# Altium footprint library common.PcbLib: 552 footprints (part 9 of 35)
Each footprint in its own frame and in the unit in brackets; x right, y up, seen from the top. Pads: shape width x height; smd on the part's side, far side on the other; paste and mask are expansions set on the pad; w line width, h text height; cw(c..) or ccw(c..) is an arc to the next point about the centre after c.
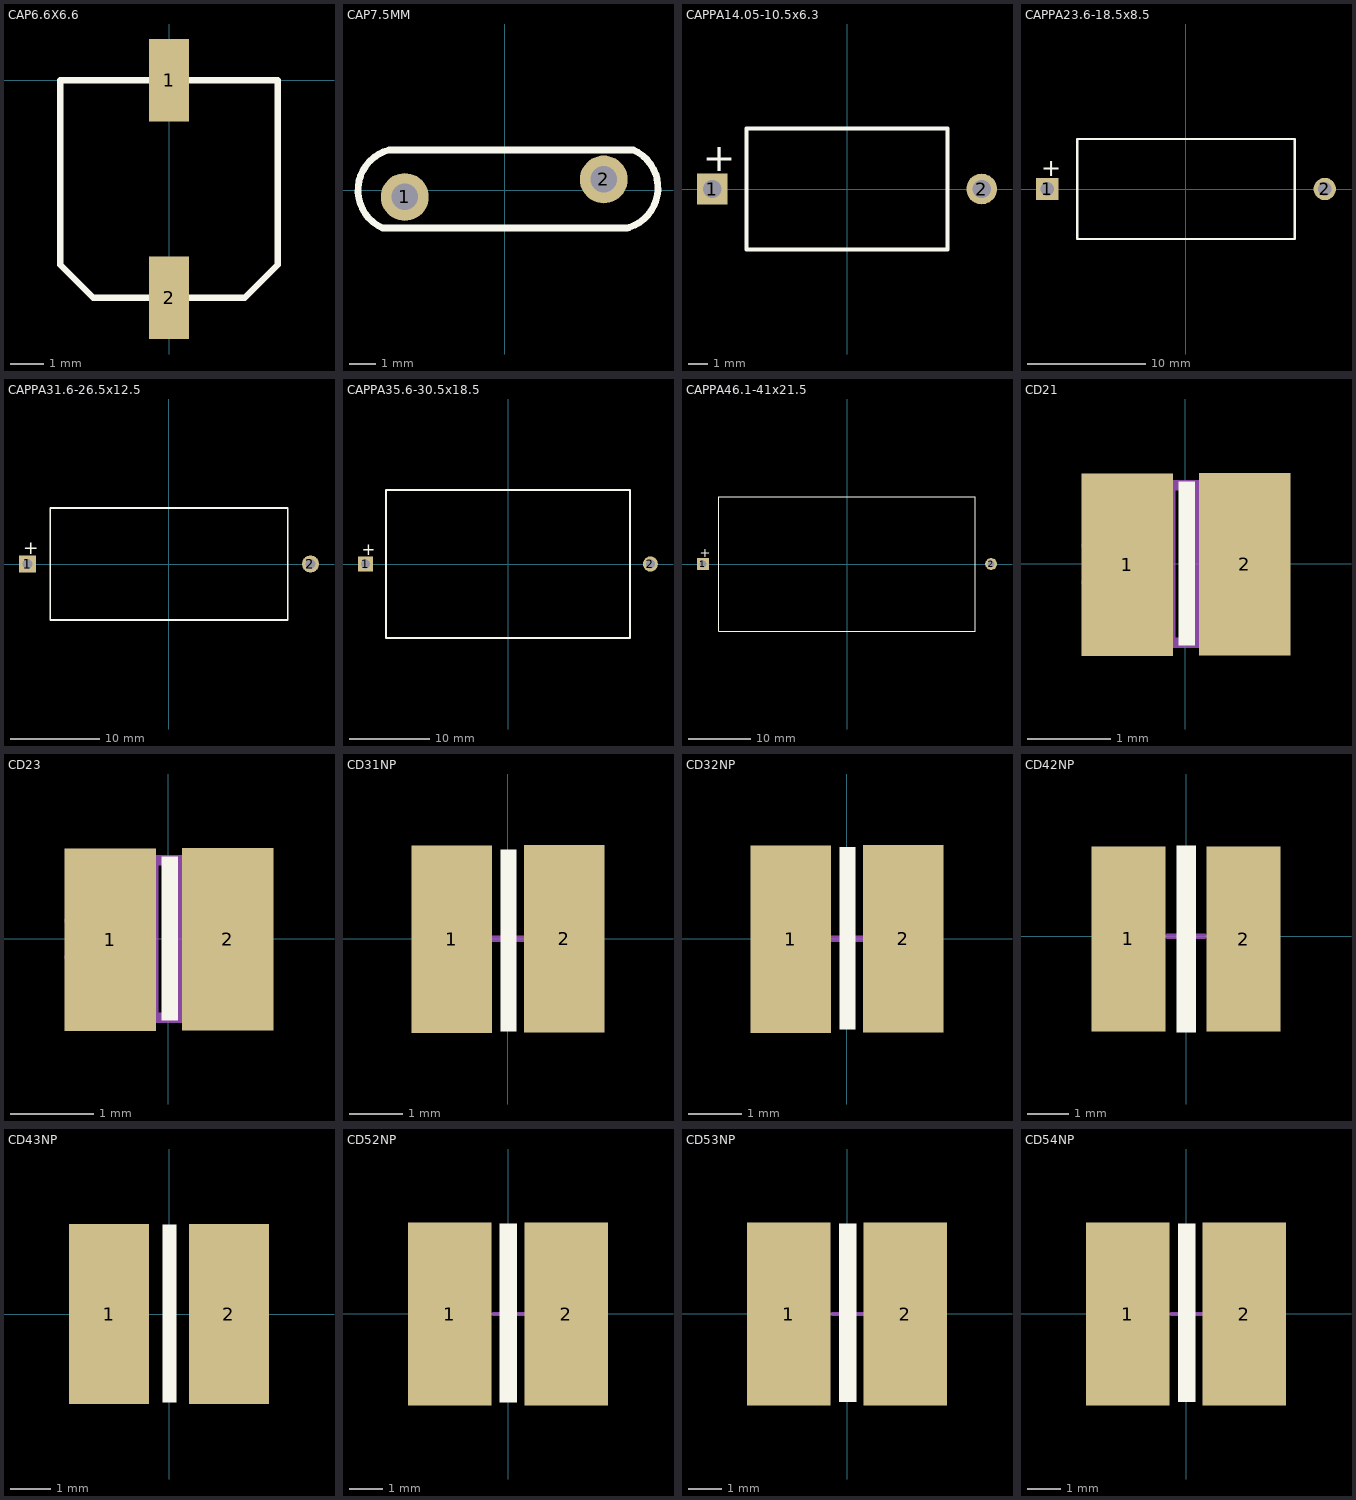
[diagram p8: the footprints below, top view; thin cyan lines are the x and y axes]

## CAP6.6X6.6 [mm] "SMDC"
pads (2):
  rect 1.2x2.5 smd: 1(0,0) 2(0,-6.6)
Top Overlay:
  lines w0.2: -3.3,-5.6 -3.3,0 0,0 3.3,0 3.3,-5.6 2.3,-6.6 -2.3,-6.6 -3.3,-5.6
3D body: height 5.2, standoff 0, extent -3.275,-6.802 3.325,0.198

## CAP7.5MM [mm]
pads (2):
  round 1.8 hole 1: 1(-3.759,-0.254) 2(3.734,0.406)
Top Overlay:
  lines w0.254: 4.623,-1.425 -4.597,-1.425 cw(c-3.958,0.003) -4.357,1.516 4.851,1.516 cw(c4.212,0.088) 4.69,-1.401
3D body: height 18.5, standoff 0, extent -5.5,-0.849 5.784,1

## CAPPA14.05-10.5x6.3 [mm] "Capacitor, Axial, Polarised; Body 10.5 x 6.3 mm (LxDia. max), Lead Dia. 0.6 mm (typ)"
height 5.08
pads (2):
  rect 1.6x1.6 hole 0.95: 1(-7.025,0)
  round 1.6 hole 0.95: 2(7.025,0)
Top Overlay:
  lines w0.2: -5.25,-3.15 -5.25,3.15 5.25,3.15 5.25,-3.15 -5.25,-3.15
  text "+" at -7.525,0.925 h1.5
3D body: height 6, standoff -0.5, extent -7.379,-2.997 7.341,3.013

## CAPPA23.6-18.5x8.5 [mm] "Capacitor, Axial, Polarised; Body 18.5 x 8.5 mm (LxDia. max), Lead Dia. 0.8 mm (typ)"
height 5.08
pads (2):
  rect 1.9x1.9 hole 1.15: 1(-11.8,0)
  round 1.9 hole 1.15: 2(11.8,0)
Top Overlay:
  lines w0.2: -9.25,-4.25 9.25,-4.25 9.25,4.25 -9.25,4.25 -9.25,-4.25
  text "+" at -12.3,1.075 h1.5
3D body: height 6, standoff -0.5, extent -12.049,-2.997 12.151,3.013

## CAPPA31.6-26.5x12.5 [mm] "Capacitor, Axial, Polarised; Body 26.5 x 12.5 mm (LxDia. max), Lead Dia. 0.8 mm (typ)"
height 5.08
pads (2):
  rect 1.9x1.9 hole 1.15: 1(-15.8,0)
  round 1.9 hole 1.15: 2(15.8,0)
Top Overlay:
  lines w0.2: -13.25,-6.25 -13.25,6.25 13.25,6.25 13.25,-6.25 -13.25,-6.25
  text "+" at -16.3,1.075 h1.5
3D body: height 12, standoff -1, extent -16.122,-6.005 16.078,6.005

## CAPPA35.6-30.5x18.5 [mm] "Capacitor, Axial, Polarised; Body 30.5 x 18.5 mm (LxDia. max), Lead Dia. 0.8 mm (typ)"
height 5.08
pads (2):
  rect 1.9x1.9 hole 1.15: 1(-17.8,0)
  round 1.9 hole 1.15: 2(17.8,0)
Top Overlay:
  lines w0.2: -15.25,-9.25 15.25,-9.25 15.25,9.25 -15.25,9.25 -15.25,-9.25
  text "+" at -18.3,1.075 h1.5
3D body: height 12, standoff -1, extent -18.091,-5.903 18.009,6.107

## CAPPA46.1-41x21.5 [mm] "Capacitor, Axial, Polarised; Body 41 x 21.5 mm (LxDia. max), Lead Dia. 0.8 mm (typ)"
height 5.08
pads (2):
  rect 1.9x1.9 hole 1.15: 1(-23.05,0)
  round 1.9 hole 1.15: 2(23.05,0)
Top Overlay:
  lines w0.2: -20.5,-10.75 -20.5,10.75 20.5,10.75 20.5,-10.75 -20.5,-10.75
  text "+" at -23.55,1.075 h1.5
3D body: height 12, standoff -1, extent -23.208,-5.929 23.292,6.081

## CD21 [mm] "CD23"
pads (2):
  rect 1.1x2.2 smd mask+0: 1(-0.702,-0.011) 2(0.716,-0.002)
Top Overlay:
  rectangle: -0.083,-0.985 0.118,0.997
Mechanical 2:
  lines w0.127: -0.181,-0.943 -0.181,0.935 ; 0.16,-0.947 0.16,0.94 ; -1.19,-0.22 ccw(c-1.447,-0.001) -1.19,0.219 cw(c-0.01,-0.001) -0.744,0.949 0.723,0.949 cw(c-0.01,-0.001) 1.169,0.22 ccw(c1.428,-0.001) 1.169,-0.221 cw(c-0.01,-0.001) 0.723,-0.951 -0.744,-0.951 cw(c-0.01,-0.001) -1.19,-0.22
Mechanical 5:
  text "C2.5 H1.6 W2.0 L2.5" at -0.856,-1.289 h0.1
3D body: height 1.6, standoff -0.05, extent -1.208,-1.024 1.259,0.976

## CD23 [mm] "CD23"
pads (2):
  rect 1.1x2.2 smd mask+0: 1(-0.702,-0.011) 2(0.716,-0.002)
Top Overlay:
  rectangle: -0.083,-0.985 0.118,0.997
Mechanical 2:
  lines w0.127: -0.181,-0.943 -0.181,0.935 ; 0.16,-0.947 0.16,0.94 ; -1.19,-0.22 ccw(c-1.447,-0.001) -1.19,0.219 cw(c-0.01,-0.001) -0.744,0.949 0.723,0.949 cw(c-0.01,-0.001) 1.169,0.22 ccw(c1.428,-0.001) 1.169,-0.221 cw(c-0.01,-0.001) 0.723,-0.951 -0.744,-0.951 cw(c-0.01,-0.001) -1.19,-0.22
Mechanical 5:
  text "C2.5 H2.0 W2.0 L2.5" at -0.79,-1.342 h0.1
3D body: height 2, standoff -0.05, extent -1.208,-1.024 1.259,0.976

## CD31NP [mm] "CD31"
pads (2):
  rect 1.5x3.5 smd mask+0: 1(-1.04,-0.012) 2(1.057,0)
Top Overlay:
  rectangle: -0.134,-1.73 0.165,1.66
Mechanical 2:
  lines w0.127: -1.485,0 1.496,0 ; 0.007,-1.4 0.007,1.4 ; -1.612,-0.32 ccw(c0.007,0) -0.867,-1.4 -0.493,-1.4 -0.493,1.4 -0.867,1.4 ccw(c0.007,0) -1.612,0.32 cw(c-1.954,0) -1.612,-0.32 ; 0.507,-1.4 0.88,-1.4 ccw(c0.007,0) 1.625,-0.323 cw(c1.964,0) 1.625,0.323 ccw(c0.007,0) 0.88,1.4 0.507,1.4 0.507,-1.4
Mechanical 5:
  text "C3.5 H1.6 W3.0 L3.5" at -1.765,-2.025 h0.2
3D body: height 1.6, standoff -0.05, extent -1.73,-1.472 1.723,1.528

## CD32NP [mm] "CD32"
pads (2):
  rect 1.5x3.5 smd mask+0: 1(-1.04,-0.012) 2(1.057,0)
Top Overlay:
  rectangle: -0.134,-1.695 0.165,1.709
Mechanical 2:
  lines w0.127: -1.485,0 1.496,0 ; 0.007,-1.4 0.007,1.4 ; -1.612,-0.32 ccw(c-1.954,0) -1.612,0.32 cw(c0.007,0) -0.867,1.4 -0.493,1.4 -0.493,-1.4 -0.867,-1.4 cw(c0.007,0) -1.612,-0.32 ; 0.507,-1.4 0.507,1.4 0.88,1.4 cw(c0.007,0) 1.625,0.323 ccw(c1.964,0) 1.625,-0.323 cw(c0.007,0) 0.88,-1.4 0.507,-1.4
Mechanical 5:
  text "C3.5 H3.2 W3.0 L3.5" at -1.791,-2.038 h0.2
3D body: height 2, standoff -0.05, extent -1.73,-1.472 1.723,1.528

## CD42NP [mm] "或者高点CX43功率电感"
pads (2):
  rect 1.8x4.5 smd mask+0: 1(-1.4,-0.064) 2(1.4,-0.07)
Top Overlay:
  rectangle: -0.232,-2.34 0.237,2.204
Mechanical 2:
  lines w0.127: -0.45,0.001 0.45,0.001 ; 0,-1.461 0,1.587 ; -2.177,-0.317 ccw(c0,0.001) -1.018,-1.949 -0.65,-1.949 -0.65,1.951 -1.018,1.951 ccw(c0,0.001) -2.177,0.318 cw(c-2.45,0.001) -2.177,-0.317 ; 0.65,-1.949 0.65,1.951 1.019,1.951 cw(c0,0.001) 2.177,0.318 ccw(c2.45,0.001) 2.177,-0.317 cw(c0,0.001) 1.019,-1.949 0.65,-1.949
Mechanical 5:
  text "C4.5 H2.0 W4.0 L4.5" at -1.799,-2.592 h0.2
3D body: height 2, standoff -0.05, extent -2.23,-2.048 2.231,1.952

## CD43NP [mm] "功率电感"
pads (2):
  rect 2x4.5 smd: 1(-1.512,0) 2(1.488,0)
Top Overlay:
  rectangle: -0.169,-2.206 0.174,2.237
Mechanical 2:
  lines w0.05: 0.623,-2.115 1.101,-2.115 ; 0.623,-2.115 1.101,-2.115 ; 0.623,-2.115 0.623,2.115 ; 0.623,2.115 1.101,2.115 ; 0.623,2.115 1.101,2.115 ; 1.101,-2.115 ccw(c-0.012,0) 2.348,-0.375 ; 1.101,-2.115 ccw(c-0.012,0) 2.348,-0.375 ; 1.101,2.115 cw(c-0.012,0) 2.348,0.375 ; 2.348,-0.375 cw(c2.438,0) 2.348,0.375 ; 2.348,-0.375 cw(c2.438,0) 2.348,0.375 ; -2.372,-0.375 ccw(c-0.012,0) -1.125,-2.115 -0.647,-2.115 -0.647,2.115 -1.125,2.115 ccw(c-0.012,0) -2.372,0.375 cw(c-2.462,0) -2.372,-0.375
Mechanical 5:
  text "C4.5 H3.2 W4.0 L4.5" at -2.417,-2.662 h0.25
3D body: height 3.5, standoff 0, extent -2.412,-2.141 2.388,2.159

## CD52NP [mm]
pads (2):
  rect 2.5x5.5 smd mask+0: 1(-1.752,-0.001) 2(1.748,-0.001)
Top Overlay:
  rectangle: -0.25,-2.65 0.274,2.716
Mechanical 2:
  lines w0.127: -0.442,-0.001 0.483,-0.001 ; -0.002,-0.257 -0.002,0.321 ; -2.831,-0.343 ccw(c-0.002,-0.001) -1.275,-2.551 -0.652,-2.551 -0.652,2.549 -1.275,2.549 ccw(c-0.002,-0.001) -2.831,0.342 cw(c-2.902,-0.001) -2.831,-0.343 ; 0.648,-2.551 1.271,-2.551 ccw(c-0.002,-0.001) 2.827,-0.343 cw(c2.898,-0.001) 2.827,0.342 ccw(c-0.002,-0.001) 1.271,2.549 0.648,2.549 0.648,-2.551
Mechanical 5:
  text "C5.8 H2.1 W5.2 L5.8" at -2.608,-3.265 h0.3
3D body: height 2.1, standoff -0.05, extent -2.889,-2.579 2.88,2.621

## CD53NP [mm]
pads (2):
  rect 2.5x5.5 smd mask+0: 1(-1.752,-0.001) 2(1.748,-0.001)
Top Overlay:
  rectangle: -0.248,-2.644 0.276,2.722
Mechanical 2:
  lines w0.127: -0.442,-0.001 0.483,-0.001 ; -0.002,-0.257 -0.002,0.321 ; -2.831,-0.343 ccw(c-2.902,-0.001) -2.831,0.342 cw(c-0.002,-0.001) -1.275,2.549 -0.652,2.549 -0.652,-2.551 -1.275,-2.551 cw(c-0.002,-0.001) -2.831,-0.343 ; 0.648,-2.551 0.648,2.549 1.271,2.549 cw(c-0.002,-0.001) 2.827,0.342 ccw(c2.898,-0.001) 2.827,-0.343 cw(c-0.002,-0.001) 1.271,-2.551 0.648,-2.551
Mechanical 5:
  text "C5.8 H3.2 W5.2 L5.8" at -2.74,-3.133 h0.3
3D body: height 3.2, standoff -0.05, extent -2.894,-2.563 2.875,2.637

## CD54NP [mm]
pads (2):
  rect 2.5x5.5 smd mask+0: 1(-1.752,-0.001) 2(1.748,-0.001)
Top Overlay:
  rectangle: -0.248,-2.644 0.276,2.722
Mechanical 2:
  lines w0.127: -0.442,-0.001 0.483,-0.001 ; -0.002,-0.257 -0.002,0.321 ; -2.831,-0.343 ccw(c-0.002,-0.001) -1.275,-2.551 -0.652,-2.551 -0.652,2.549 -1.275,2.549 ccw(c-0.002,-0.001) -2.831,0.342 cw(c-2.902,-0.001) -2.831,-0.343 ; 0.648,-2.551 1.271,-2.551 ccw(c-0.002,-0.001) 2.827,-0.343 cw(c2.898,-0.001) 2.827,0.342 ccw(c-0.002,-0.001) 1.271,2.549 0.648,2.549 0.648,-2.551
Mechanical 5:
  text "C5.8 H4.5 W5.2 L5.8" at -2.637,-3.157 h0.3
3D body: height 4.5, standoff -0.05, extent -2.895,-2.599 2.874,2.601